# Altium footprint library ST封装.PcbLib: 1336 footprints (part 70 of 109)
Each footprint in its own frame and in the unit in brackets; x right, y up, seen from the top. Pads: shape width x height; smd on the part's side, far side on the other; paste and mask are expansions set on the pad; w line width, h text height; cw(c..) or ccw(c..) is an arc to the next point about the centre after c.
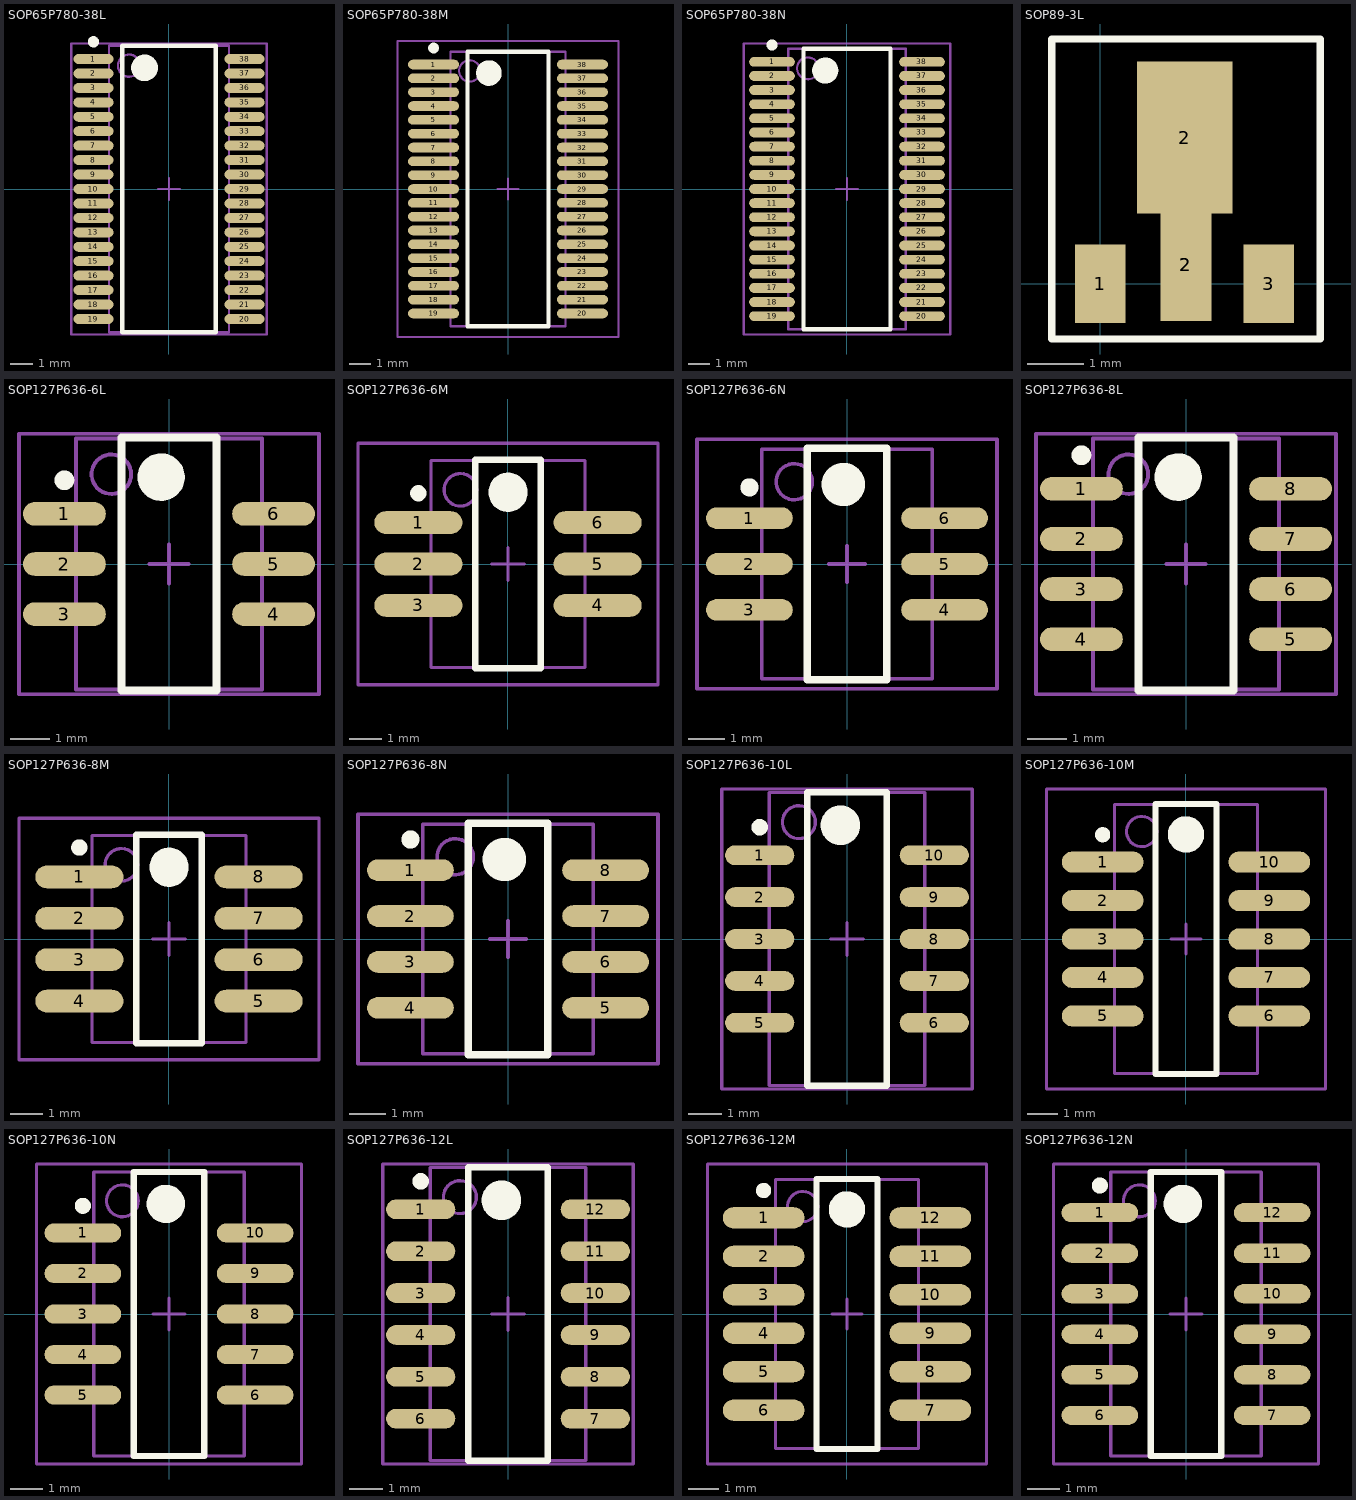
[diagram p69: the footprints below, top view; thin cyan lines are the x and y axes]

## SOP65P780-38L [mm] "SOP, 38-Leads, Body 12.6x5.3mm, Pitch 0.65mm, IPC High Density"
height 2
pads (38):
  oval 1.8x0.45 smd: 1(-3.4,5.85) 2(-3.4,5.2) 3(-3.4,4.55) 4(-3.4,3.9) 5(-3.4,3.25) 6(-3.4,2.6) 7(-3.4,1.95) 8(-3.4,1.3) 9(-3.4,0.65) 10(-3.4,0) 11(-3.4,-0.65) 12(-3.4,-1.3) 13(-3.4,-1.95) 14(-3.4,-2.6) 15(-3.4,-3.25) 16(-3.4,-3.9) 17(-3.4,-4.55) 18(-3.4,-5.2) 19(-3.4,-5.85) 20(3.4,-5.85) 21(3.4,-5.2) 22(3.4,-4.55) 23(3.4,-3.9) 24(3.4,-3.25) 25(3.4,-2.6) 26(3.4,-1.95) 27(3.4,-1.3) 28(3.4,-0.65) 29(3.4,0) 30(3.4,0.65) 31(3.4,1.3) 32(3.4,1.95) 33(3.4,2.6) 34(3.4,3.25) 35(3.4,3.9) 36(3.4,4.55) 37(3.4,5.2) 38(3.4,5.85)
Top Overlay:
  circle w0.6: c-1.1,5.45 r0.3
  circle w0.25: c-3.4,6.625 r0.125
  lines w0.2: -2.1,-6.45 2.1,-6.45 2.1,6.45 -2.1,6.45 -2.1,-6.45
Mechanical 13:
  circle w0.1: c-1.8,5.55 r0.5
  lines w0.1: -2.7,-6.45 2.7,-6.45 2.7,6.45 -2.7,6.45 -2.7,-6.45
Mechanical 15:
  lines w0.1: -0.5,0 0.5,0 ; 0,-0.5 0,0.5 ; -4.4,-6.55 4.4,-6.55 4.4,6.55 -4.4,6.55 -4.4,-6.55
3D body: height 2, standoff 0, extent -2.7,-6.45 2.7,6.45

## SOP65P780-38M [mm] "SOP, 38-Leads, Body 12.6x5.3mm, Pitch 0.65mm, IPC Low Density"
height 2
pads (38):
  oval 2.4x0.45 smd: 1(-3.5,5.85) 2(-3.5,5.2) 3(-3.5,4.55) 4(-3.5,3.9) 5(-3.5,3.25) 6(-3.5,2.6) 7(-3.5,1.95) 8(-3.5,1.3) 9(-3.5,0.65) 10(-3.5,0) 11(-3.5,-0.65) 12(-3.5,-1.3) 13(-3.5,-1.95) 14(-3.5,-2.6) 15(-3.5,-3.25) 16(-3.5,-3.9) 17(-3.5,-4.55) 18(-3.5,-5.2) 19(-3.5,-5.85) 20(3.5,-5.85) 21(3.5,-5.2) 22(3.5,-4.55) 23(3.5,-3.9) 24(3.5,-3.25) 25(3.5,-2.6) 26(3.5,-1.95) 27(3.5,-1.3) 28(3.5,-0.65) 29(3.5,0) 30(3.5,0.65) 31(3.5,1.3) 32(3.5,1.95) 33(3.5,2.6) 34(3.5,3.25) 35(3.5,3.9) 36(3.5,4.55) 37(3.5,5.2) 38(3.5,5.85)
Top Overlay:
  circle w0.25: c-3.5,6.625 r0.125
  circle w0.6: c-0.9,5.45 r0.3
  lines w0.2: -1.9,-6.45 -1.9,6.45 1.9,6.45 1.9,-6.45 -1.9,-6.45
Mechanical 13:
  circle w0.1: c-1.8,5.55 r0.5
  lines w0.1: -2.7,-6.45 -2.7,6.45 2.7,6.45 2.7,-6.45 -2.7,-6.45
Mechanical 15:
  lines w0.1: -0.5,0 0.5,0 ; 0,-0.5 0,0.5 ; -5.2,-6.95 -5.2,6.95 5.2,6.95 5.2,-6.95 -5.2,-6.95
3D body: height 2, standoff 0, extent -2.7,-6.45 2.7,6.45

## SOP65P780-38N [mm] "SOP, 38-Leads, Body 12.6x5.3mm, Pitch 0.65mm, IPC Medium Density"
height 2
pads (38):
  oval 2.1x0.45 smd: 1(-3.45,5.85) 2(-3.45,5.2) 3(-3.45,4.55) 4(-3.45,3.9) 5(-3.45,3.25) 6(-3.45,2.6) 7(-3.45,1.95) 8(-3.45,1.3) 9(-3.45,0.65) 10(-3.45,0) 11(-3.45,-0.65) 12(-3.45,-1.3) 13(-3.45,-1.95) 14(-3.45,-2.6) 15(-3.45,-3.25) 16(-3.45,-3.9) 17(-3.45,-4.55) 18(-3.45,-5.2) 19(-3.45,-5.85) 20(3.45,-5.85) 21(3.45,-5.2) 22(3.45,-4.55) 23(3.45,-3.9) 24(3.45,-3.25) 25(3.45,-2.6) 26(3.45,-1.95) 27(3.45,-1.3) 28(3.45,-0.65) 29(3.45,0) 30(3.45,0.65) 31(3.45,1.3) 32(3.45,1.95) 33(3.45,2.6) 34(3.45,3.25) 35(3.45,3.9) 36(3.45,4.55) 37(3.45,5.2) 38(3.45,5.85)
Top Overlay:
  circle w0.6: c-1,5.45 r0.3
  circle w0.25: c-3.45,6.625 r0.125
  lines w0.2: -2,-6.45 2,-6.45 2,6.45 -2,6.45 -2,-6.45
Mechanical 13:
  circle w0.1: c-1.8,5.55 r0.5
  lines w0.1: -2.7,-6.45 2.7,-6.45 2.7,6.45 -2.7,6.45 -2.7,-6.45
Mechanical 15:
  lines w0.1: -0.5,0 0.5,0 ; 0,-0.5 0,0.5 ; -4.75,-6.7 4.75,-6.7 4.75,6.7 -4.75,6.7 -4.75,-6.7
3D body: height 2, standoff 0, extent -2.7,-6.45 2.7,6.45

## SOP89-3L [mm]
pads (5):
  rect 0.9x1.4 smd: 1(0,0) 3(3,0)
  rect 1.7x2.7 smd: 2(1.5,2.6)
  rect 0.9x2 smd: 2(1.525,0.339)
  rect 0.9x2 on Bottom Solder: 2(1.525,0.339)
Top Overlay:
  lines w0.127: -0.862,-0.981 3.913,-0.981 3.913,4.353 -0.862,4.353 -0.862,-0.981

## SOP127P636-6L [mm] "SOP, 6-Leads, Body 6x4.7mm, Pitch 1.27mm, IPC High Density"
height 1.5
pads (6):
  oval 2.1x0.6 smd: 1(-2.65,1.27) 2(-2.65,0) 3(-2.65,-1.27) 4(2.65,-1.27) 5(2.65,0) 6(2.65,1.27)
Top Overlay:
  circle w0.25: c-2.65,2.12 r0.125
  circle w0.6: c-0.2,2.2 r0.3
  lines w0.2: -1.2,-3.2 -1.2,3.2 1.2,3.2 1.2,-3.2 -1.2,-3.2
Mechanical 13:
  circle w0.1: c-1.46,2.275 r0.5
  lines w0.1: -2.36,-3.175 -2.36,3.175 2.36,3.175 2.36,-3.175 -2.36,-3.175
Mechanical 15:
  lines w0.1: -0.5,0 0.5,0 ; 0,-0.5 0,0.5 ; -3.8,-3.3 -3.8,3.3 3.8,3.3 3.8,-3.3 -3.8,-3.3
3D body: height 1.5, standoff 0, extent -2.36,-3.175 2.36,3.175

## SOP127P636-6M [mm] "SOP, 6-Leads, Body 6x4.7mm, Pitch 1.27mm, IPC Low Density"
height 1.5
pads (6):
  oval 2.7x0.7 smd: 1(-2.75,1.27) 2(-2.75,0) 3(-2.75,-1.27) 4(2.75,-1.27) 5(2.75,0) 6(2.75,1.27)
Top Overlay:
  circle w0.25: c-2.75,2.17 r0.125
  circle w0.6: c0,2.2 r0.3
  lines w0.2: -1,-3.2 -1,3.2 1,3.2 1,-3.2 -1,-3.2
Mechanical 13:
  circle w0.1: c-1.46,2.275 r0.5
  lines w0.1: -2.36,-3.175 -2.36,3.175 2.36,3.175 2.36,-3.175 -2.36,-3.175
Mechanical 15:
  lines w0.1: -0.5,0 0.5,0 ; 0,-0.5 0,0.5 ; -4.6,-3.7 -4.6,3.7 4.6,3.7 4.6,-3.7 -4.6,-3.7
3D body: height 1.5, standoff 0, extent -2.36,-3.175 2.36,3.175

## SOP127P636-6N [mm] "SOP, 6-Leads, Body 6x4.7mm, Pitch 1.27mm, IPC Medium Density"
height 1.5
pads (6):
  oval 2.4x0.6 smd: 1(-2.7,1.27) 2(-2.7,0) 3(-2.7,-1.27) 4(2.7,-1.27) 5(2.7,0) 6(2.7,1.27)
Top Overlay:
  circle w0.6: c-0.1,2.2 r0.3
  circle w0.25: c-2.7,2.12 r0.125
  lines w0.2: -1.1,-3.2 1.1,-3.2 1.1,3.2 -1.1,3.2 -1.1,-3.2
Mechanical 13:
  circle w0.1: c-1.46,2.275 r0.5
  lines w0.1: -2.36,-3.175 2.36,-3.175 2.36,3.175 -2.36,3.175 -2.36,-3.175
Mechanical 15:
  lines w0.1: -0.5,0 0.5,0 ; 0,-0.5 0,0.5 ; -4.15,-3.45 4.15,-3.45 4.15,3.45 -4.15,3.45 -4.15,-3.45
3D body: height 1.5, standoff 0, extent -2.36,-3.175 2.36,3.175

## SOP127P636-8L [mm] "SOP, 8-Leads, Body 6x4.7mm, Pitch 1.27mm, IPC High Density"
height 1.5
pads (8):
  oval 2.1x0.6 smd: 1(-2.65,1.905) 2(-2.65,0.635) 3(-2.65,-0.635) 4(-2.65,-1.905) 5(2.65,-1.905) 6(2.65,-0.635) 7(2.65,0.635) 8(2.65,1.905)
Top Overlay:
  circle w0.6: c-0.2,2.2 r0.3
  circle w0.25: c-2.65,2.755 r0.125
  lines w0.2: -1.2,-3.2 1.2,-3.2 1.2,3.2 -1.2,3.2 -1.2,-3.2
Mechanical 13:
  circle w0.1: c-1.46,2.275 r0.5
  lines w0.1: -2.36,-3.175 2.36,-3.175 2.36,3.175 -2.36,3.175 -2.36,-3.175
Mechanical 15:
  lines w0.1: -0.5,0 0.5,0 ; 0,-0.5 0,0.5 ; -3.8,-3.3 3.8,-3.3 3.8,3.3 -3.8,3.3 -3.8,-3.3
3D body: height 1.5, standoff 0, extent -2.36,-3.175 2.36,3.175

## SOP127P636-8M [mm] "SOP, 8-Leads, Body 6x4.7mm, Pitch 1.27mm, IPC Low Density"
height 1.5
pads (8):
  oval 2.7x0.7 smd: 1(-2.75,1.905) 2(-2.75,0.635) 3(-2.75,-0.635) 4(-2.75,-1.905) 5(2.75,-1.905) 6(2.75,-0.635) 7(2.75,0.635) 8(2.75,1.905)
Top Overlay:
  circle w0.6: c0,2.2 r0.3
  circle w0.25: c-2.75,2.805 r0.125
  lines w0.2: -1,-3.2 1,-3.2 1,3.2 -1,3.2 -1,-3.2
Mechanical 13:
  circle w0.1: c-1.46,2.275 r0.5
  lines w0.1: -2.36,-3.175 2.36,-3.175 2.36,3.175 -2.36,3.175 -2.36,-3.175
Mechanical 15:
  lines w0.1: -0.5,0 0.5,0 ; 0,-0.5 0,0.5 ; -4.6,-3.7 4.6,-3.7 4.6,3.7 -4.6,3.7 -4.6,-3.7
3D body: height 1.5, standoff 0, extent -2.36,-3.175 2.36,3.175

## SOP127P636-8N [mm] "SOP, 8-Leads, Body 6x4.7mm, Pitch 1.27mm, IPC Medium Density"
height 1.5
pads (8):
  oval 2.4x0.6 smd: 1(-2.7,1.905) 2(-2.7,0.635) 3(-2.7,-0.635) 4(-2.7,-1.905) 5(2.7,-1.905) 6(2.7,-0.635) 7(2.7,0.635) 8(2.7,1.905)
Top Overlay:
  circle w0.6: c-0.1,2.2 r0.3
  circle w0.25: c-2.7,2.755 r0.125
  lines w0.2: -1.1,-3.2 1.1,-3.2 1.1,3.2 -1.1,3.2 -1.1,-3.2
Mechanical 13:
  circle w0.1: c-1.46,2.275 r0.5
  lines w0.1: -2.36,-3.175 2.36,-3.175 2.36,3.175 -2.36,3.175 -2.36,-3.175
Mechanical 15:
  lines w0.1: -0.5,0 0.5,0 ; 0,-0.5 0,0.5 ; -4.15,-3.45 4.15,-3.45 4.15,3.45 -4.15,3.45 -4.15,-3.45
3D body: height 1.5, standoff 0, extent -2.36,-3.175 2.36,3.175

## SOP127P636-10L [mm] "SOP, 10-Leads, Body 8.5x4.7mm, Pitch 1.27mm, IPC High Density"
height 1.5
pads (10):
  oval 2.1x0.6 smd: 1(-2.65,2.54) 2(-2.65,1.27) 3(-2.65,0) 4(-2.65,-1.27) 5(-2.65,-2.54) 6(2.65,-2.54) 7(2.65,-1.27) 8(2.65,0) 9(2.65,1.27) 10(2.65,2.54)
Top Overlay:
  circle w0.6: c-0.2,3.45 r0.3
  circle w0.25: c-2.65,3.39 r0.125
  lines w0.2: -1.2,-4.45 1.2,-4.45 1.2,4.45 -1.2,4.45 -1.2,-4.45
Mechanical 13:
  circle w0.1: c-1.46,3.545 r0.5
  lines w0.1: -2.36,-4.445 2.36,-4.445 2.36,4.445 -2.36,4.445 -2.36,-4.445
Mechanical 15:
  lines w0.1: -0.5,0 0.5,0 ; 0,-0.5 0,0.5 ; -3.8,-4.55 3.8,-4.55 3.8,4.55 -3.8,4.55 -3.8,-4.55
3D body: height 1.5, standoff 0, extent -2.36,-4.445 2.36,4.445

## SOP127P636-10M [mm] "SOP, 10-Leads, Body 8.5x4.7mm, Pitch 1.27mm, IPC Low Density"
height 1.5
pads (10):
  oval 2.7x0.7 smd: 1(-2.75,2.54) 2(-2.75,1.27) 3(-2.75,0) 4(-2.75,-1.27) 5(-2.75,-2.54) 6(2.75,-2.54) 7(2.75,-1.27) 8(2.75,0) 9(2.75,1.27) 10(2.75,2.54)
Top Overlay:
  circle w0.6: c0,3.45 r0.3
  circle w0.25: c-2.75,3.44 r0.125
  lines w0.2: -1,-4.45 1,-4.45 1,4.45 -1,4.45 -1,-4.45
Mechanical 13:
  circle w0.1: c-1.46,3.545 r0.5
  lines w0.1: -2.36,-4.445 2.36,-4.445 2.36,4.445 -2.36,4.445 -2.36,-4.445
Mechanical 15:
  lines w0.1: -0.5,0 0.5,0 ; 0,-0.5 0,0.5 ; -4.6,-4.95 4.6,-4.95 4.6,4.95 -4.6,4.95 -4.6,-4.95
3D body: height 1.5, standoff 0, extent -2.36,-4.445 2.36,4.445

## SOP127P636-10N [mm] "SOP, 10-Leads, Body 8.5x4.7mm, Pitch 1.27mm, IPC Medium Density"
height 1.5
pads (10):
  oval 2.4x0.6 smd: 1(-2.7,2.54) 2(-2.7,1.27) 3(-2.7,0) 4(-2.7,-1.27) 5(-2.7,-2.54) 6(2.7,-2.54) 7(2.7,-1.27) 8(2.7,0) 9(2.7,1.27) 10(2.7,2.54)
Top Overlay:
  circle w0.6: c-0.1,3.45 r0.3
  circle w0.25: c-2.7,3.39 r0.125
  lines w0.2: -1.1,-4.45 1.1,-4.45 1.1,4.45 -1.1,4.45 -1.1,-4.45
Mechanical 13:
  circle w0.1: c-1.46,3.545 r0.5
  lines w0.1: -2.36,-4.445 2.36,-4.445 2.36,4.445 -2.36,4.445 -2.36,-4.445
Mechanical 15:
  lines w0.1: -0.5,0 0.5,0 ; 0,-0.5 0,0.5 ; -4.15,-4.7 4.15,-4.7 4.15,4.7 -4.15,4.7 -4.15,-4.7
3D body: height 1.5, standoff 0, extent -2.36,-4.445 2.36,4.445

## SOP127P636-12L [mm] "SOP, 12-Leads, Body 8.5x4.7mm, Pitch 1.27mm, IPC High Density"
height 1.5
pads (12):
  oval 2.1x0.6 smd: 1(-2.65,3.175) 2(-2.65,1.905) 3(-2.65,0.635) 4(-2.65,-0.635) 5(-2.65,-1.905) 6(-2.65,-3.175) 7(2.65,-3.175) 8(2.65,-1.905) 9(2.65,-0.635) 10(2.65,0.635) 11(2.65,1.905) 12(2.65,3.175)
Top Overlay:
  circle w0.25: c-2.65,4.025 r0.125
  circle w0.6: c-0.2,3.45 r0.3
  lines w0.2: -1.2,-4.45 -1.2,4.45 1.2,4.45 1.2,-4.45 -1.2,-4.45
Mechanical 13:
  circle w0.1: c-1.46,3.545 r0.5
  lines w0.1: -2.36,-4.445 -2.36,4.445 2.36,4.445 2.36,-4.445 -2.36,-4.445
Mechanical 15:
  lines w0.1: -0.5,0 0.5,0 ; 0,-0.5 0,0.5 ; -3.8,-4.55 -3.8,4.55 3.8,4.55 3.8,-4.55 -3.8,-4.55
3D body: height 1.5, standoff 0, extent -2.36,-4.445 2.36,4.445

## SOP127P636-12M [mm] "SOP, 12-Leads, Body 8.5x4.7mm, Pitch 1.27mm, IPC Low Density"
height 1.5
pads (12):
  oval 2.7x0.7 smd: 1(-2.75,3.175) 2(-2.75,1.905) 3(-2.75,0.635) 4(-2.75,-0.635) 5(-2.75,-1.905) 6(-2.75,-3.175) 7(2.75,-3.175) 8(2.75,-1.905) 9(2.75,-0.635) 10(2.75,0.635) 11(2.75,1.905) 12(2.75,3.175)
Top Overlay:
  circle w0.6: c0,3.45 r0.3
  circle w0.25: c-2.75,4.075 r0.125
  lines w0.2: -1,-4.45 1,-4.45 1,4.45 -1,4.45 -1,-4.45
Mechanical 13:
  circle w0.1: c-1.46,3.545 r0.5
  lines w0.1: -2.36,-4.445 2.36,-4.445 2.36,4.445 -2.36,4.445 -2.36,-4.445
Mechanical 15:
  lines w0.1: -0.5,0 0.5,0 ; 0,-0.5 0,0.5 ; -4.6,-4.95 4.6,-4.95 4.6,4.95 -4.6,4.95 -4.6,-4.95
3D body: height 1.5, standoff 0, extent -2.36,-4.445 2.36,4.445

## SOP127P636-12N [mm] "SOP, 12-Leads, Body 8.5x4.7mm, Pitch 1.27mm, IPC Medium Density"
height 1.5
pads (12):
  oval 2.4x0.6 smd: 1(-2.7,3.175) 2(-2.7,1.905) 3(-2.7,0.635) 4(-2.7,-0.635) 5(-2.7,-1.905) 6(-2.7,-3.175) 7(2.7,-3.175) 8(2.7,-1.905) 9(2.7,-0.635) 10(2.7,0.635) 11(2.7,1.905) 12(2.7,3.175)
Top Overlay:
  circle w0.6: c-0.1,3.45 r0.3
  circle w0.25: c-2.7,4.025 r0.125
  lines w0.2: -1.1,-4.45 1.1,-4.45 1.1,4.45 -1.1,4.45 -1.1,-4.45
Mechanical 13:
  circle w0.1: c-1.46,3.545 r0.5
  lines w0.1: -2.36,-4.445 2.36,-4.445 2.36,4.445 -2.36,4.445 -2.36,-4.445
Mechanical 15:
  lines w0.1: -0.5,0 0.5,0 ; 0,-0.5 0,0.5 ; -4.15,-4.7 4.15,-4.7 4.15,4.7 -4.15,4.7 -4.15,-4.7
3D body: height 1.5, standoff 0, extent -2.36,-4.445 2.36,4.445